# Altium footprint library terminal_blocks.PcbLib: 74 footprints (part 4 of 5)
Each footprint in its own frame and in the unit in brackets; x right, y up, seen from the top. Pads: shape width x height; smd on the part's side, far side on the other; paste and mask are expansions set on the pad; w line width, h text height; cw(c..) or ccw(c..) is an arc to the next point about the centre after c.
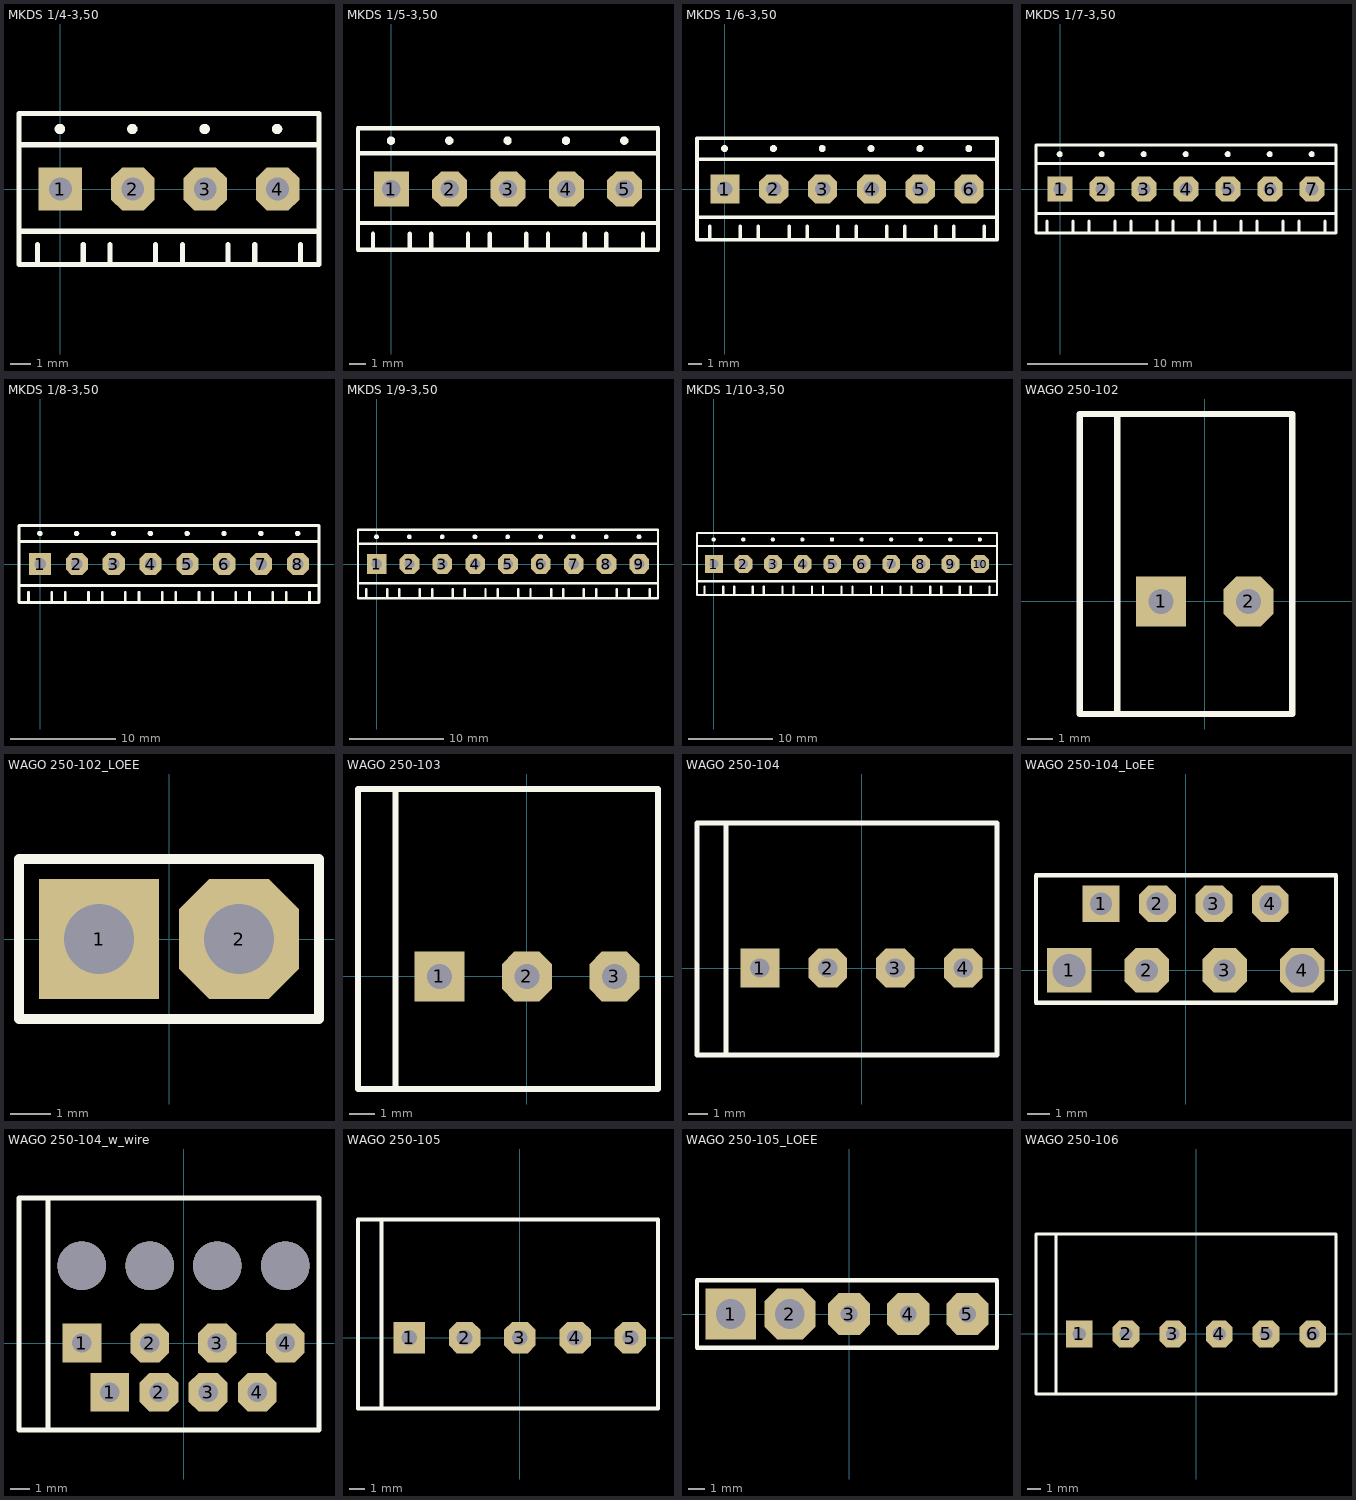
[diagram p3: the footprints below, top view; thin cyan lines are the x and y axes]

## MKDS 1/4-3,50 [mm] "Phoenix Contact MKDS 1, 3,50mm PITCH PCB Terminal Block"
height 8.5
pads (4):
  rect 2.1x2.1 hole 1.1: 1(0,0)
  oct 2.1x2.1 hole 1.1: 2(3.5,0) 3(7,0) 4(10.5,0)
Top Overlay:
  circle w0.25: c10.475,2.9 r0.125
  circle w0.25: c6.975,2.9 r0.125
  circle w0.25: c3.475,2.9 r0.125
  circle w0.25: c-0.025,2.9 r0.125
  lines w0.254: -2,-2.04 12.5,-2.04 ; -2,2.14 12.5,2.14 ; -1.1,-3.65 -1.1,-2.684 ; 1.1,-3.65 1.1,-2.684 ; 2.4,-3.65 2.4,-2.684 ; 4.6,-3.65 4.6,-2.684 ; 5.9,-3.65 5.9,-2.684 ; 8.1,-3.65 8.1,-2.684 ; 9.4,-3.65 9.4,-2.684 ; 11.6,-3.65 11.6,-2.684 ; -2,-3.65 12.5,-3.65 12.5,3.65 -2,3.65 -2,-3.65
3D body "1751264.stp": height 8.5, standoff -3.5, extent -2,-3.65 12.5,3.65

## MKDS 1/5-3,50 [mm] "Phoenix Contact MKDS 1, 3,50mm PITCH PCB Terminal Block"
height 8.5
pads (5):
  rect 2.1x2.1 hole 1.1: 1(0,0)
  oct 2.1x2.1 hole 1.1: 2(3.5,0) 3(7,0) 4(10.5,0) 5(14,0)
Top Overlay:
  circle w0.25: c-0.025,2.9 r0.125
  circle w0.25: c3.475,2.9 r0.125
  circle w0.25: c6.975,2.9 r0.125
  circle w0.25: c10.475,2.9 r0.125
  circle w0.25: c13.975,2.9 r0.125
  lines w0.254: -2,-2.04 16,-2.04 ; -2,2.14 16,2.14 ; -1.1,-3.65 -1.1,-2.684 ; 1.1,-3.65 1.1,-2.684 ; 2.4,-3.65 2.4,-2.684 ; 4.6,-3.65 4.6,-2.684 ; 5.9,-3.65 5.9,-2.684 ; 8.1,-3.65 8.1,-2.684 ; 9.4,-3.65 9.4,-2.684 ; 11.6,-3.65 11.6,-2.684 ; 12.9,-3.65 12.9,-2.684 ; 15.1,-3.65 15.1,-2.684 ; -2,-3.65 -2,3.65 16,3.65 16,-3.65 -2,-3.65
3D body "1751277.stp": height 8.5, standoff -3.5, extent -2,-3.65 16,3.65

## MKDS 1/6-3,50 [mm] "Phoenix Contact MKDS 1, 3,50mm PITCH PCB Terminal Block"
height 8.5
pads (6):
  rect 2.1x2.1 hole 1.1: 1(0,0)
  oct 2.1x2.1 hole 1.1: 2(3.5,0) 3(7,0) 4(10.5,0) 5(14,0) 6(17.5,0)
Top Overlay:
  circle w0.25: c-0.025,2.9 r0.125
  circle w0.25: c3.475,2.9 r0.125
  circle w0.25: c6.975,2.9 r0.125
  circle w0.25: c10.475,2.9 r0.125
  circle w0.25: c13.975,2.9 r0.125
  circle w0.25: c17.475,2.9 r0.125
  lines w0.254: -2,-2.04 19.5,-2.04 ; -2,2.14 19.5,2.14 ; -1.1,-3.65 -1.1,-2.684 ; 1.1,-3.65 1.1,-2.684 ; 2.4,-3.65 2.4,-2.684 ; 4.6,-3.65 4.6,-2.684 ; 5.9,-3.65 5.9,-2.684 ; 8.1,-3.65 8.1,-2.684 ; 9.4,-3.65 9.4,-2.684 ; 11.6,-3.65 11.6,-2.684 ; 12.9,-3.65 12.9,-2.684 ; 15.1,-3.65 15.1,-2.684 ; 16.4,-3.65 16.4,-2.684 ; 18.6,-3.65 18.6,-2.684 ; -2,-3.65 -2,3.65 19.5,3.65 19.5,-3.65 -2,-3.65
3D body "1751280.stp": height 8.5, standoff -3.5, extent -2,-3.65 19.5,3.65

## MKDS 1/7-3,50 [mm] "Phoenix Contact MKDS 1, 3,50mm PITCH PCB Terminal Block"
height 8.5
pads (7):
  rect 2.1x2.1 hole 1.1: 1(0,0)
  oct 2.1x2.1 hole 1.1: 2(3.5,0) 3(7,0) 4(10.5,0) 5(14,0) 6(17.5,0) 7(21,0)
Top Overlay:
  circle w0.25: c20.975,2.9 r0.125
  circle w0.25: c17.475,2.9 r0.125
  circle w0.25: c13.975,2.9 r0.125
  circle w0.25: c10.475,2.9 r0.125
  circle w0.25: c6.975,2.9 r0.125
  circle w0.25: c3.475,2.9 r0.125
  circle w0.25: c-0.025,2.9 r0.125
  lines w0.254: -2,-2.04 23,-2.04 ; -2,2.14 23,2.14 ; -1.1,-3.65 -1.1,-2.684 ; 1.1,-3.65 1.1,-2.684 ; 2.4,-3.65 2.4,-2.684 ; 4.6,-3.65 4.6,-2.684 ; 5.9,-3.65 5.9,-2.684 ; 8.1,-3.65 8.1,-2.684 ; 9.4,-3.65 9.4,-2.684 ; 11.6,-3.65 11.6,-2.684 ; 12.9,-3.65 12.9,-2.684 ; 15.1,-3.65 15.1,-2.684 ; 16.4,-3.65 16.4,-2.684 ; 18.6,-3.65 18.6,-2.684 ; 19.9,-3.65 19.9,-2.684 ; 22.1,-3.65 22.1,-2.684 ; -2,-3.65 23,-3.65 23,3.65 -2,3.65 -2,-3.65
3D body "1751293.stp": height 8.5, standoff -3.5, extent -2,-3.65 23,3.65

## MKDS 1/8-3,50 [mm] "Phoenix Contact MKDS 1, 3,50mm PITCH PCB Terminal Block"
height 8.5
pads (8):
  rect 2.1x2.1 hole 1.1: 1(0,0)
  oct 2.1x2.1 hole 1.1: 2(3.5,0) 3(7,0) 4(10.5,0) 5(14,0) 6(17.5,0) 7(21,0) 8(24.5,0)
Top Overlay:
  circle w0.25: c24.475,2.9 r0.125
  circle w0.25: c20.975,2.9 r0.125
  circle w0.25: c17.475,2.9 r0.125
  circle w0.25: c13.975,2.9 r0.125
  circle w0.25: c10.475,2.9 r0.125
  circle w0.25: c6.975,2.9 r0.125
  circle w0.25: c3.475,2.9 r0.125
  circle w0.25: c-0.025,2.9 r0.125
  lines w0.254: -2,-2.04 26.5,-2.04 ; -2,2.14 26.5,2.14 ; -1.1,-3.65 -1.1,-2.684 ; 1.1,-3.65 1.1,-2.684 ; 2.4,-3.65 2.4,-2.684 ; 4.6,-3.65 4.6,-2.684 ; 5.9,-3.65 5.9,-2.684 ; 8.1,-3.65 8.1,-2.684 ; 9.4,-3.65 9.4,-2.684 ; 11.6,-3.65 11.6,-2.684 ; 12.9,-3.65 12.9,-2.684 ; 15.1,-3.65 15.1,-2.684 ; 16.4,-3.65 16.4,-2.684 ; 18.6,-3.65 18.6,-2.684 ; 19.9,-3.65 19.9,-2.684 ; 22.1,-3.65 22.1,-2.684 ; 23.4,-3.65 23.4,-2.684 ; 25.6,-3.65 25.6,-2.684 ; -2,-3.65 26.5,-3.65 26.5,3.65 -2,3.65 -2,-3.65
3D body "1751303.stp": height 8.5, standoff -3.5, extent -2,-3.65 26.5,3.65

## MKDS 1/9-3,50 [mm] "Phoenix Contact MKDS 1, 3,50mm PITCH PCB Terminal Block"
height 8.5
pads (9):
  rect 2.1x2.1 hole 1.1: 1(0,0)
  oct 2.1x2.1 hole 1.1: 2(3.5,0) 3(7,0) 4(10.5,0) 5(14,0) 6(17.5,0) 7(21,0) 8(24.5,0) 9(28,0)
Top Overlay:
  circle w0.25: c-0.025,2.9 r0.125
  circle w0.25: c3.475,2.9 r0.125
  circle w0.25: c6.975,2.9 r0.125
  circle w0.25: c10.475,2.9 r0.125
  circle w0.25: c13.975,2.9 r0.125
  circle w0.25: c17.475,2.9 r0.125
  circle w0.25: c20.975,2.9 r0.125
  circle w0.25: c24.475,2.9 r0.125
  circle w0.25: c27.975,2.9 r0.125
  lines w0.254: -2,-2.04 30,-2.04 ; -2,2.14 30,2.14 ; -1.1,-3.65 -1.1,-2.684 ; 1.1,-3.65 1.1,-2.684 ; 2.4,-3.65 2.4,-2.684 ; 4.6,-3.65 4.6,-2.684 ; 5.9,-3.65 5.9,-2.684 ; 8.1,-3.65 8.1,-2.684 ; 9.4,-3.65 9.4,-2.684 ; 11.6,-3.65 11.6,-2.684 ; 12.9,-3.65 12.9,-2.684 ; 15.1,-3.65 15.1,-2.684 ; 16.4,-3.65 16.4,-2.684 ; 18.6,-3.65 18.6,-2.684 ; 19.9,-3.65 19.9,-2.684 ; 22.1,-3.65 22.1,-2.684 ; 23.4,-3.65 23.4,-2.684 ; 25.6,-3.65 25.6,-2.684 ; 26.9,-3.65 26.9,-2.684 ; 29.1,-3.65 29.1,-2.684 ; -2,-3.65 -2,3.65 30,3.65 30,-3.65 -2,-3.65
3D body "1751316.stp": height 8.5, standoff -3.5, extent -2,-3.65 30,3.65

## MKDS 1/10-3,50 [mm] "Phoenix Contact MKDS 1, 3,50mm PITCH PCB Terminal Block"
height 8.5
pads (10):
  rect 2.1x2.1 hole 1.1: 1(0,0)
  oct 2.1x2.1 hole 1.1: 2(3.5,0) 3(7,0) 4(10.5,0) 5(14,0) 6(17.5,0) 7(21,0) 8(24.5,0) 9(28,0) 10(31.5,0)
Top Overlay:
  circle w0.25: c31.475,2.9 r0.125
  circle w0.25: c27.975,2.9 r0.125
  circle w0.25: c24.475,2.9 r0.125
  circle w0.25: c20.975,2.9 r0.125
  circle w0.25: c17.475,2.9 r0.125
  circle w0.25: c13.975,2.9 r0.125
  circle w0.25: c10.475,2.9 r0.125
  circle w0.25: c6.975,2.9 r0.125
  circle w0.25: c3.475,2.9 r0.125
  circle w0.25: c-0.025,2.9 r0.125
  lines w0.254: -2,-2.04 33.5,-2.04 ; -2,2.14 33.5,2.14 ; -1.1,-3.65 -1.1,-2.684 ; 1.1,-3.65 1.1,-2.684 ; 2.4,-3.65 2.4,-2.684 ; 4.6,-3.65 4.6,-2.684 ; 5.9,-3.65 5.9,-2.684 ; 8.1,-3.65 8.1,-2.684 ; 9.4,-3.65 9.4,-2.684 ; 11.6,-3.65 11.6,-2.684 ; 12.9,-3.65 12.9,-2.684 ; 15.1,-3.65 15.1,-2.684 ; 16.4,-3.65 16.4,-2.684 ; 18.6,-3.65 18.6,-2.684 ; 19.9,-3.65 19.9,-2.684 ; 22.1,-3.65 22.1,-2.684 ; 23.4,-3.65 23.4,-2.684 ; 25.6,-3.65 25.6,-2.684 ; 26.9,-3.65 26.9,-2.684 ; 29.1,-3.65 29.1,-2.684 ; 30.4,-3.65 30.4,-2.684 ; 32.6,-3.65 32.6,-2.684 ; -2,-3.65 33.5,-3.65 33.5,3.65 -2,3.65 -2,-3.65
3D body "1751329.stp": height 8.5, standoff -3.5, extent -2,-3.65 33.5,3.65

## WAGO 250-102 [mm] "Wago 250 Series 3,50mm, 2 Contacts"
height 13.1
pads (2):
  rect 2x2 hole 1: 1(-1.75,0)
  oct 2x2 hole 1: 2(1.75,0)
Top Overlay:
  lines w0.254: -3.5,-4.5 -3.5,7.5 ; -3.5,-4.5 3.5,-4.5 3.5,7.5 -3.5,7.5 ; -3.5,-4.5 -5,-4.5 -5,7.5 -3.5,7.5
3D body "User Library-wago250-101.step": height 12.67, standoff 0, extent -5,-4.5 0,7.5
3D body "User Library-wago250-101_no_tap.step": height 12.68, standoff 0, extent 0,-4.5 3.5,7.5

## WAGO 250-102_LOEE [mm] "Wago 250 Series 3,50mm, 2 Contacts"
height 13.1
pads (2):
  rect 3x3 hole 1.75: 1(-1.75,0)
  oct 3x3 hole 1.75: 2(1.75,0)
Top Overlay:
  lines w0.254: -3.75,-2 -3.75,2 3.75,2 3.75,-2 -3.75,-2

## WAGO 250-103 [mm] "Wago 250 Series 3,50mm, 3 Contacts"
height 13.1
pads (3):
  rect 2x2 hole 1: 1(-3.5,0)
  oct 2x2 hole 1: 2(0,0) 3(3.5,0)
Top Overlay:
  lines w0.254: -5.25,-4.5 -5.25,7.5 ; -5.25,-4.5 5.25,-4.5 5.25,7.5 -5.25,7.5 ; -5.25,-4.5 -6.75,-4.5 -6.75,7.5 -5.25,7.5
3D body "User Library-wago250-101.step": height 12.67, standoff 0, extent -6.75,-4.5 -1.75,7.5
3D body "User Library-wago250-101_no_tap.step": height 12.68, standoff 0, extent -1.75,-4.5 1.75,7.5
3D body "User Library-wago250-101_no_tap.step": height 12.68, standoff 0, extent 1.75,-4.5 5.25,7.5

## WAGO 250-104 [mm] "Wago 250 Series 3,50mm, 4 Contacts"
height 13.1
pads (4):
  rect 2x2 hole 1: 1(-5.25,0)
  oct 2x2 hole 1: 2(-1.75,0) 3(1.75,0) 4(5.25,0)
Top Overlay:
  lines w0.254: -7,-4.5 -7,7.5 ; -7,-4.5 7,-4.5 7,7.5 -7,7.5 ; -7,-4.5 -8.5,-4.5 -8.5,7.5 -7,7.5
3D body "User Library-wago250-101_no_tap.step": height 12.68, standoff 0, extent 3.5,-4.5 7,7.5
3D body "User Library-wago250-101.step": height 12.67, standoff 0, extent -8.5,-4.5 -3.5,7.5
3D body "User Library-wago250-101_no_tap.step": height 12.68, standoff 0, extent -3.5,-4.5 0,7.5
3D body "User Library-wago250-101_no_tap.step": height 12.68, standoff 0, extent 0,-4.5 3.5,7.5

## WAGO 250-104_LoEE [mm] "Wago 250 Series 3,50mm, 4 Contacts"
height 13.1
pads (8):
  rect 2x2 hole 1.5: 1(-5.25,0)
  rect 1.651x1.651 hole 1: 1(-3.81,3)
  oct 2x2 hole 1: 2(-1.75,0) 3(1.75,0)
  oct 1.651x1.651 hole 1: 2(-1.27,3) 3(1.27,3) 4(3.81,3)
  oct 2x2 hole 1.5: 4(5.25,0)
Top Overlay:
  lines w0.2: -6.737,-1.461 -6.737,4.289 6.763,4.289 6.763,-1.461 -6.737,-1.461
3D body "User Library-wago250-101_no_tap.step": height 12.68, standoff 0, extent 0,-4.5 3.5,7.5
3D body "User Library-wago250-101_no_tap.step": height 12.68, standoff 0, extent -3.5,-4.5 0,7.5
3D body "User Library-wago250-101.step": height 12.67, standoff 0, extent -8.5,-4.5 -3.5,7.5
3D body "User Library-wago250-101_no_tap.step": height 12.68, standoff 0, extent 3.5,-4.5 7,7.5

## WAGO 250-104_w_wire [mm] "Wago 250 Series 3,50mm, 4 Contacts"
height 13.1
pads (8):
  rect 2x2 hole 1: 1(-5.25,0) 1(-3.81,-2.54)
  oct 2x2 hole 1: 2(-1.75,0) 2(-1.27,-2.54) 3(1.27,-2.54) 3(1.75,0) 4(3.81,-2.54) 4(5.25,0)
via 5.25,4 diameter 2.5 hole 2.5
via 1.75,4 diameter 2.5 hole 2.5
via -1.75,4 diameter 2.5 hole 2.5
via -5.25,4 diameter 2.5 hole 2.5
Top Overlay:
  lines w0.254: -7,-4.5 -7,7.5 ; -7,-4.5 7,-4.5 7,7.5 -7,7.5 ; -7,-4.5 -8.5,-4.5 -8.5,7.5 -7,7.5
3D body "User Library-wago250-101_no_tap.step": height 12.68, standoff 0, extent 3.5,-4.5 7,7.5
3D body "User Library-wago250-101.step": height 12.67, standoff 0, extent -8.5,-4.5 -3.5,7.5
3D body "User Library-wago250-101_no_tap.step": height 12.68, standoff 0, extent -3.5,-4.5 0,7.5
3D body "User Library-wago250-101_no_tap.step": height 12.68, standoff 0, extent 0,-4.5 3.5,7.5

## WAGO 250-105 [mm] "Wago 250 Series 3,50mm, 5 Contacts"
height 13.1
pads (5):
  rect 2x2 hole 1: 1(-7,0)
  oct 2x2 hole 1: 2(-3.5,0) 3(0,0) 4(3.5,0) 5(7,0)
Top Overlay:
  lines w0.254: -8.75,-4.5 -10.25,-4.5 -10.25,7.5 -8.75,7.5 ; -8.75,-4.5 8.75,-4.5 8.75,7.5 -8.75,7.5 ; -8.75,-4.5 -8.75,7.5
3D body "User Library-wago250-101_no_tap.step": height 12.68, standoff 0, extent 5.25,-4.5 8.75,7.5
3D body "User Library-wago250-101_no_tap.step": height 12.68, standoff 0, extent -1.75,-4.5 1.75,7.5
3D body "User Library-wago250-101_no_tap.step": height 12.68, standoff 0, extent -5.25,-4.5 -1.75,7.5
3D body "User Library-wago250-101.step": height 12.67, standoff 0, extent -10.25,-4.5 -5.25,7.5
3D body "User Library-wago250-101_no_tap.step": height 12.68, standoff 0, extent 1.75,-4.5 5.25,7.5

## WAGO 250-105_LOEE [mm] "Wago 250 Series 3,50mm, 5 Contacts"
height 13.1
pads (5):
  rect 3x3 hole 1.75: 1(-7,0)
  oct 3x3 hole 1.75: 2(-3.5,0)
  oct 2.5x2.5 hole 1: 3(0,0) 4(3.5,0) 5(7,0)
Top Overlay:
  lines w0.254: -9,-2 -9,2 8.75,2 8.75,-2 -9,-2

## WAGO 250-106 [mm] "Wago 250 Series 3,50mm, 6 Contacts"
height 13.1
pads (6):
  rect 2x2 hole 1: 1(-8.75,0)
  oct 2x2 hole 1: 2(-5.25,0) 3(-1.75,0) 4(1.75,0) 5(5.25,0) 6(8.75,0)
Top Overlay:
  lines w0.254: -10.5,-4.5 -12,-4.5 -12,7.5 -10.5,7.5 ; -10.5,-4.5 10.5,-4.5 10.5,7.5 -10.5,7.5 ; -10.5,-4.5 -10.5,7.5
3D body "User Library-wago250-101_no_tap.step": height 12.68, standoff 0, extent 3.5,-4.5 7,7.5
3D body "User Library-wago250-101_no_tap.step": height 12.68, standoff 0, extent -3.5,-4.5 0,7.5
3D body "User Library-wago250-101_no_tap.step": height 12.68, standoff 0, extent -7,-4.5 -3.5,7.5
3D body "User Library-wago250-101.step": height 12.67, standoff 0, extent -12,-4.5 -7,7.5
3D body "User Library-wago250-101_no_tap.step": height 12.68, standoff 0, extent 0,-4.5 3.5,7.5
3D body "User Library-wago250-101_no_tap.step": height 12.68, standoff 0, extent 7,-4.5 10.5,7.5